# Altium footprint library WR-TBL_Rising Cage Clamp.PcbLib: 435 footprints (part 27 of 28)
Each footprint in its own frame and in the unit in brackets; x right, y up, seen from the top. Pads: shape width x height; smd on the part's side, far side on the other; paste and mask are expansions set on the pad; w line width, h text height; cw(c..) or ccw(c..) is an arc to the next point about the centre after c.
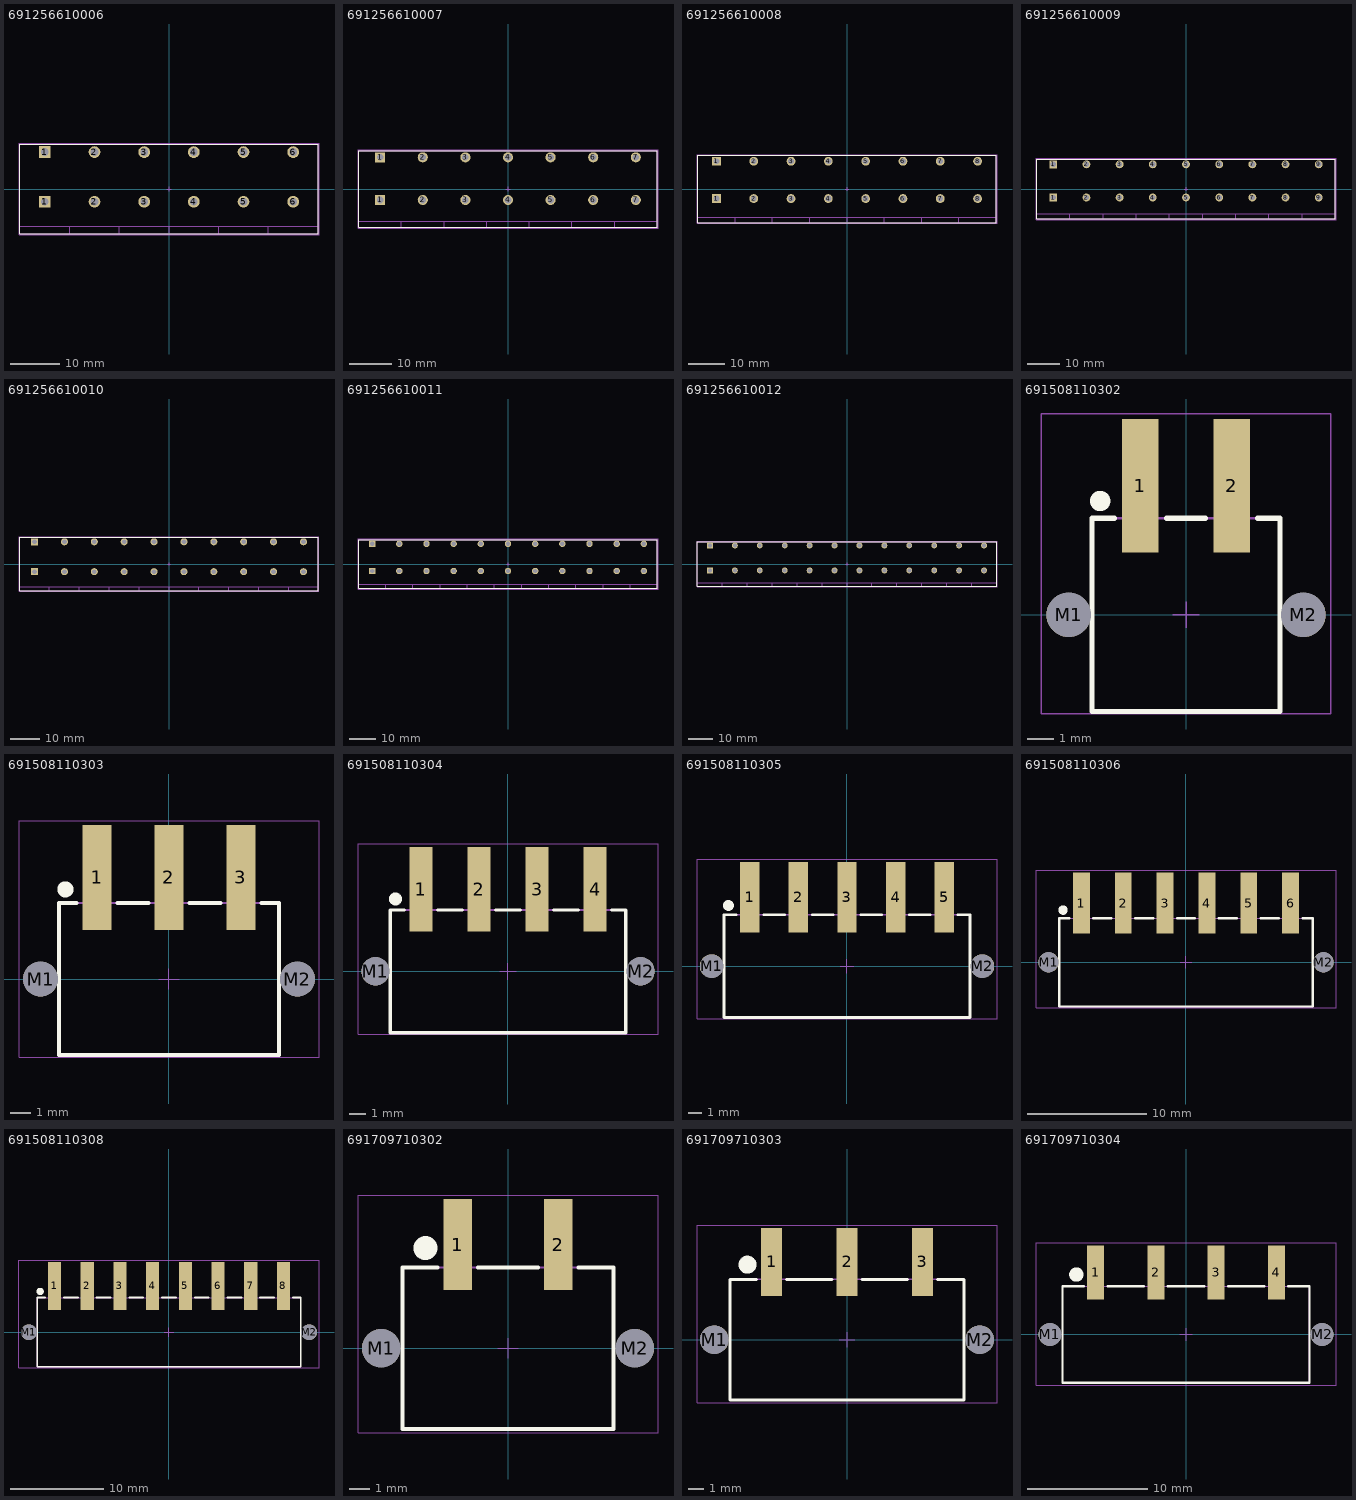
[diagram p26: the footprints below, top view; thin cyan lines are the x and y axes]

## 691256610006 [mm] "10.16mm Horizontal Cable Entry with Rising Cage Clamp, 06p"
height 29.3
pads (12):
  rect 2.4x2.4 hole 1.6: 1(-25.4,-2.61) 1(-25.4,7.55)
  round 2.4 hole 1.6: 2(-15.24,-2.61) 2(-15.24,7.55) 3(-5.08,-2.61) 3(-5.08,7.55) 4(5.08,-2.61) 4(5.08,7.55) 5(15.24,-2.61) 5(15.24,7.55) 6(25.4,-2.61) 6(25.4,7.55)
Top Overlay:
  lines w0.2: -30.48,-9.15 -30.48,9.15 30.48,9.15 30.48,-9.15 -30.48,-9.15
Mechanical 13:
  lines w0.1: -30.48,-7.65 30.48,-7.65 ; -20.32,-9.15 -20.32,-7.65 ; -10.16,-9.15 -10.16,-7.65 ; 0,-9.15 0,-7.65 ; 10.16,-9.15 10.16,-7.65 ; 20.32,-9.15 20.32,-7.65 ; -30.48,-9.15 30.48,-9.15 30.48,9.15 -30.48,9.15 -30.48,-9.15
Mechanical 15:
  lines w0.05: -0.5,0 0.5,0 ; 0,-0.5 0,0.5 ; -30.68,-9.35 -30.68,9.35 30.68,9.35 30.68,-9.35 -30.68,-9.35
3D body "691256610006.stp": height 29.33, standoff -4.97, extent -30.48,-9.15 30.48,9.15

## 691256610007 [mm] "10.16mm Horizontal Cable Entry with Rising Cage Clamp, 07p"
height 29.3
pads (14):
  rect 2.4x2.4 hole 1.6: 1(-30.48,-2.61) 1(-30.48,7.55)
  round 2.4 hole 1.6: 2(-20.32,-2.61) 2(-20.32,7.55) 3(-10.16,-2.61) 3(-10.16,7.55) 4(0,-2.61) 4(0,7.55) 5(10.16,-2.61) 5(10.16,7.55) 6(20.32,-2.61) 6(20.32,7.55) 7(30.48,-2.61) 7(30.48,7.55)
Top Overlay:
  lines w0.2: -35.56,-9.15 -35.56,9.15 35.56,9.15 35.56,-9.15 -35.56,-9.15
Mechanical 13:
  lines w0.1: -35.56,-7.65 35.56,-7.65 ; -25.4,-9.15 -25.4,-7.65 ; -15.24,-9.15 -15.24,-7.65 ; -5.08,-9.15 -5.08,-7.65 ; 5.08,-9.15 5.08,-7.65 ; 15.24,-9.15 15.24,-7.65 ; 25.4,-9.15 25.4,-7.65 ; -35.56,-9.15 35.56,-9.15 35.56,9.15 -35.56,9.15 -35.56,-9.15
Mechanical 15:
  lines w0.05: -0.5,0 0.5,0 ; 0,-0.5 0,0.5 ; -35.76,-9.35 -35.76,9.35 35.76,9.35 35.76,-9.35 -35.76,-9.35
3D body "691256610007.stp": height 29.33, standoff -4.97, extent -35.56,-9.15 35.56,9.15

## 691256610008 [mm] "10.16mm Horizontal Cable Entry with Rising Cage Clamp, 08p"
height 29.3
pads (16):
  rect 2.4x2.4 hole 1.6: 1(-35.56,-2.61) 1(-35.56,7.55)
  round 2.4 hole 1.6: 2(-25.4,-2.61) 2(-25.4,7.55) 3(-15.24,-2.61) 3(-15.24,7.55) 4(-5.08,-2.61) 4(-5.08,7.55) 5(5.08,-2.61) 5(5.08,7.55) 6(15.24,-2.61) 6(15.24,7.55) 7(25.4,-2.61) 7(25.4,7.55) 8(35.56,-2.61) 8(35.56,7.55)
Top Overlay:
  lines w0.2: -40.64,-9.15 40.64,-9.15 40.64,9.15 -40.64,9.15 -40.64,-9.15
Mechanical 13:
  lines w0.1: -40.64,-7.65 40.64,-7.65 ; -30.48,-9.15 -30.48,-7.65 ; -20.32,-9.15 -20.32,-7.65 ; -10.16,-9.15 -10.16,-7.65 ; 0,-9.15 0,-7.65 ; 10.16,-9.15 10.16,-7.65 ; 20.32,-9.15 20.32,-7.65 ; 30.48,-9.15 30.48,-7.65 ; -40.64,-9.15 -40.64,9.15 40.64,9.15 40.64,-9.15 -40.64,-9.15
Mechanical 15:
  lines w0.05: -0.5,0 0.5,0 ; 0,-0.5 0,0.5 ; -40.84,-9.35 40.84,-9.35 40.84,9.35 -40.84,9.35 -40.84,-9.35
3D body "691256610008.stp": height 29.33, standoff -4.97, extent -40.64,-9.15 40.64,9.15

## 691256610009 [mm] "10.16mm Horizontal Cable Entry with Rising Cage Clamp, 09p"
height 29.3
pads (18):
  rect 2.4x2.4 hole 1.6: 1(-40.64,-2.61) 1(-40.64,7.55)
  round 2.4 hole 1.6: 2(-30.48,-2.61) 2(-30.48,7.55) 3(-20.32,-2.61) 3(-20.32,7.55) 4(-10.16,-2.61) 4(-10.16,7.55) 5(0,-2.61) 5(0,7.55) 6(10.16,-2.61) 6(10.16,7.55) 7(20.32,-2.61) 7(20.32,7.55) 8(30.48,-2.61) 8(30.48,7.55) 9(40.64,-2.61) 9(40.64,7.55)
Top Overlay:
  lines w0.2: -45.72,-9.15 45.72,-9.15 45.72,9.15 -45.72,9.15 -45.72,-9.15
Mechanical 13:
  lines w0.1: -45.72,-7.65 45.72,-7.65 ; -35.56,-9.15 -35.56,-7.65 ; -25.4,-9.15 -25.4,-7.65 ; -15.24,-9.15 -15.24,-7.65 ; -5.08,-9.15 -5.08,-7.65 ; 5.08,-9.15 5.08,-7.65 ; 15.24,-9.15 15.24,-7.65 ; 25.4,-9.15 25.4,-7.65 ; 35.56,-9.15 35.56,-7.65 ; -45.72,-9.15 -45.72,9.15 45.72,9.15 45.72,-9.15 -45.72,-9.15
Mechanical 15:
  lines w0.05: -0.5,0 0.5,0 ; 0,-0.5 0,0.5 ; -45.92,-9.35 45.92,-9.35 45.92,9.35 -45.92,9.35 -45.92,-9.35
3D body "691256610009.stp": height 29.33, standoff -4.97, extent -45.72,-9.15 45.72,9.15

## 691256610010 [mm] "10.16mm Horizontal Cable Entry with Rising Cage Clamp, 10p"
height 29.3
pads (20):
  rect 2.4x2.4 hole 1.6: 1(-45.72,-2.61) 1(-45.72,7.55)
  round 2.4 hole 1.6: 2(-35.56,-2.61) 2(-35.56,7.55) 3(-25.4,-2.61) 3(-25.4,7.55) 4(-15.24,-2.61) 4(-15.24,7.55) 5(-5.08,-2.61) 5(-5.08,7.55) 6(5.08,-2.61) 6(5.08,7.55) 7(15.24,-2.61) 7(15.24,7.55) 8(25.4,-2.61) 8(25.4,7.55) 9(35.56,-2.61) 9(35.56,7.55) 10(45.72,-2.61) 10(45.72,7.55)
Top Overlay:
  lines w0.2: -50.8,-9.15 50.8,-9.15 50.8,9.15 -50.8,9.15 -50.8,-9.15
Mechanical 13:
  lines w0.1: -50.8,-7.65 50.8,-7.65 ; -40.64,-9.15 -40.64,-7.65 ; -30.48,-9.15 -30.48,-7.65 ; -20.32,-9.15 -20.32,-7.65 ; -10.16,-9.15 -10.16,-7.65 ; 0,-9.15 0,-7.65 ; 10.16,-9.15 10.16,-7.65 ; 20.32,-9.15 20.32,-7.65 ; 30.48,-9.15 30.48,-7.65 ; 40.64,-9.15 40.64,-7.65 ; -50.8,-9.15 -50.8,9.15 50.8,9.15 50.8,-9.15 -50.8,-9.15
Mechanical 15:
  lines w0.05: -0.5,0 0.5,0 ; 0,-0.5 0,0.5 ; -51,-9.35 51,-9.35 51,9.35 -51,9.35 -51,-9.35
3D body "691256610010.stp": height 29.33, standoff -4.97, extent -50.8,-9.15 50.8,9.15

## 691256610011 [mm] "10.16mm Horizontal Cable Entry with Rising Cage Clamp, 11p"
height 29.3
pads (22):
  rect 2.4x2.4 hole 1.6: 1(-50.8,-2.61) 1(-50.8,7.55)
  round 2.4 hole 1.6: 2(-40.64,-2.61) 2(-40.64,7.55) 3(-30.48,-2.61) 3(-30.48,7.55) 4(-20.32,-2.61) 4(-20.32,7.55) 5(-10.16,-2.61) 5(-10.16,7.55) 6(0,-2.61) 6(0,7.55) 7(10.16,-2.61) 7(10.16,7.55) 8(20.32,-2.61) 8(20.32,7.55) 9(30.48,-2.61) 9(30.48,7.55) 10(40.64,-2.61) 10(40.64,7.55) 11(50.8,-2.61) 11(50.8,7.55)
Top Overlay:
  lines w0.2: -55.88,-9.15 55.88,-9.15 55.88,9.15 -55.88,9.15 -55.88,-9.15
Mechanical 13:
  lines w0.1: -55.88,-7.65 55.88,-7.65 ; -45.72,-9.15 -45.72,-7.65 ; -35.56,-9.15 -35.56,-7.65 ; -25.4,-9.15 -25.4,-7.65 ; -15.24,-9.15 -15.24,-7.65 ; -5.08,-9.15 -5.08,-7.65 ; 5.08,-9.15 5.08,-7.65 ; 15.24,-9.15 15.24,-7.65 ; 25.4,-9.15 25.4,-7.65 ; 35.56,-9.15 35.56,-7.65 ; 45.72,-9.15 45.72,-7.65 ; -55.88,-9.15 -55.88,9.15 55.88,9.15 55.88,-9.15 -55.88,-9.15
Mechanical 15:
  lines w0.05: -0.5,0 0.5,0 ; 0,-0.5 0,0.5 ; -56.08,-9.35 56.08,-9.35 56.08,9.35 -56.08,9.35 -56.08,-9.35
3D body "691256610011.stp": height 29.33, standoff -4.97, extent -55.88,-9.15 55.88,9.15

## 691256610012 [mm] "10.16mm Horizontal Cable Entry with Rising Cage Clamp, 12p"
height 29.3
pads (24):
  rect 2.4x2.4 hole 1.6: 1(-55.88,-2.61) 1(-55.88,7.55)
  round 2.4 hole 1.6: 2(-45.72,-2.61) 2(-45.72,7.55) 3(-35.56,-2.61) 3(-35.56,7.55) 4(-25.4,-2.61) 4(-25.4,7.55) 5(-15.24,-2.61) 5(-15.24,7.55) 6(-5.08,-2.61) 6(-5.08,7.55) 7(5.08,-2.61) 7(5.08,7.55) 8(15.24,-2.61) 8(15.24,7.55) 9(25.4,-2.61) 9(25.4,7.55) 10(35.56,-2.61) 10(35.56,7.55) 11(45.72,-2.61) 11(45.72,7.55) 12(55.88,-2.61) 12(55.88,7.55)
Top Overlay:
  lines w0.2: -60.96,-9.15 -60.96,9.15 60.96,9.15 60.96,-9.15 -60.96,-9.15
Mechanical 13:
  lines w0.1: -60.96,-7.65 60.96,-7.65 ; -50.8,-9.15 -50.8,-7.65 ; -40.64,-9.15 -40.64,-7.65 ; -30.48,-9.15 -30.48,-7.65 ; -20.32,-9.15 -20.32,-7.65 ; -10.16,-9.15 -10.16,-7.65 ; 0,-9.15 0,-7.65 ; 10.16,-9.15 10.16,-7.65 ; 20.32,-9.15 20.32,-7.65 ; 30.48,-9.15 30.48,-7.65 ; 40.64,-9.15 40.64,-7.65 ; 50.8,-9.15 50.8,-7.65 ; -60.96,-9.15 60.96,-9.15 60.96,9.15 -60.96,9.15 -60.96,-9.15
Mechanical 15:
  lines w0.05: -0.5,0 0.5,0 ; 0,-0.5 0,0.5 ; -61.16,-9.35 -61.16,9.35 61.16,9.35 61.16,-9.35 -61.16,-9.35
3D body "691256610012.stp": height 29.33, standoff -4.97, extent -60.96,-9.15 60.96,9.15

## 691508110302 [mm] "WR-TBL Terminal block - serie 5081 3,50mm - SMT - Horizontal entry with rising clamp - 02p"
height 11.2
pads (4):
  rect 1.4x5.1 smd: 1(-1.75,4.95) 2(1.75,4.95)
  round 1.7 hole 1.7 unplated: M1(-4.5,0) M2(4.5,0)
Top Overlay:
  circle w0.5: c-3.29,4.365 r0.142
  lines w0.2: -2.75,3.7 -3.6,3.7 -3.6,-3.7 3.6,-3.7 3.6,3.7 2.75,3.7 ; -0.75,3.7 0.75,3.7
Mechanical 13:
  lines w0.1: -2.225,3.7 -2.225,7.2 -1.275,7.2 -1.275,3.7 ; 1.275,3.7 1.275,7.2 2.225,7.2 2.225,3.7 ; -3.6,-3.7 3.6,-3.7 3.6,3.7 -3.6,3.7 -3.6,-3.7
Mechanical 15:
  lines w0.05: -0.5,0 0.5,0 ; 0,-0.5 0,0.5 ; -5.55,-3.8 5.55,-3.8 5.55,7.7 -5.55,7.7 -5.55,-3.8
3D body "691508110302.stp": height 11.25, standoff -1.95, extent -5.175,-3.695 5.175,7.205

## 691508110303 [mm] "WR-TBL Terminal block - serie 5081 3,50mm - SMT - Horizontal entry with rising clamp - 03p"
height 11.2
pads (5):
  rect 1.4x5.1 smd: 1(-3.5,4.95) 2(0,4.95) 3(3.5,4.95)
  round 1.7 hole 1.7 unplated: M1(-6.25,0) M2(6.25,0)
Top Overlay:
  circle w0.5: c-5.04,4.365 r0.142
  lines w0.2: -4.5,3.7 -5.35,3.7 -5.35,-3.7 5.35,-3.7 5.35,3.7 4.5,3.7 ; -2.5,3.7 -1,3.7 ; 1,3.7 2.5,3.7
Mechanical 13:
  lines w0.1: -3.975,3.7 -3.975,7.2 -3.025,7.2 -3.025,3.7 ; -0.475,3.7 -0.475,7.2 0.475,7.2 0.475,3.7 ; 3.025,3.7 3.025,7.2 3.975,7.2 3.975,3.7 ; -5.35,-3.7 5.35,-3.7 5.35,3.7 -5.35,3.7 -5.35,-3.7
Mechanical 15:
  lines w0.05: -0.5,0 0.5,0 ; 0,-0.5 0,0.5 ; -7.3,-3.8 7.3,-3.8 7.3,7.7 -7.3,7.7 -7.3,-3.8
3D body "691508110303.stp": height 11.25, standoff -1.95, extent -6.925,-3.7 6.925,7.2

## 691508110304 [mm] "WR-TBL Terminal block - serie 5081 3,50mm - SMT - Horizontal entry with rising clamp - 04p"
height 11.2
pads (6):
  rect 1.4x5.1 smd: 1(-5.25,4.95) 2(-1.75,4.95) 3(1.75,4.95) 4(5.25,4.95)
  round 1.7 hole 1.7 unplated: M1(-8,0) M2(8,0)
Top Overlay:
  circle w0.5: c-6.79,4.365 r0.142
  lines w0.2: -6.25,3.7 -7.1,3.7 -7.1,-3.7 7.1,-3.7 7.1,3.7 6.25,3.7 ; -4.25,3.7 -2.75,3.7 ; -0.75,3.7 0.75,3.7 ; 2.75,3.7 4.25,3.7
Mechanical 13:
  lines w0.1: -5.725,3.7 -5.725,7.2 -4.775,7.2 -4.775,3.7 ; -2.225,3.7 -2.225,7.2 -1.275,7.2 -1.275,3.7 ; 1.275,3.7 1.275,7.2 2.225,7.2 2.225,3.7 ; 4.775,3.7 4.775,7.2 5.725,7.2 5.725,3.7 ; -7.1,-3.7 7.1,-3.7 7.1,3.7 -7.1,3.7 -7.1,-3.7
Mechanical 15:
  lines w0.05: -0.5,0 0.5,0 ; 0,-0.5 0,0.5 ; -9.05,-3.8 9.05,-3.8 9.05,7.7 -9.05,7.7 -9.05,-3.8
3D body "691508110304.stp": height 11.25, standoff -1.95, extent -8.675,-3.7 8.675,7.2

## 691508110305 [mm] "WR-TBL Terminal block - serie 5081 3,50mm - SMT - Horizontal entry with rising clamp - 05p"
height 11.2
pads (7):
  rect 1.4x5.1 smd: 1(-7,4.95) 2(-3.5,4.95) 3(0,4.95) 4(3.5,4.95) 5(7,4.95)
  round 1.7 hole 1.7 unplated: M1(-9.75,0) M2(9.75,0)
Top Overlay:
  circle w0.5: c-8.54,4.365 r0.142
  lines w0.2: -8,3.7 -8.85,3.7 -8.85,-3.7 8.85,-3.7 8.85,3.7 8,3.7 ; -6,3.7 -4.5,3.7 ; -2.5,3.7 -1,3.7 ; 1,3.7 2.5,3.7 ; 4.5,3.7 6,3.7
Mechanical 13:
  lines w0.1: -7.475,3.7 -7.475,7.2 -6.525,7.2 -6.525,3.7 ; -3.975,3.7 -3.975,7.2 -3.025,7.2 -3.025,3.7 ; -0.475,3.7 -0.475,7.2 0.475,7.2 0.475,3.7 ; 3.025,3.7 3.025,7.2 3.975,7.2 3.975,3.7 ; 6.525,3.7 6.525,7.2 7.475,7.2 7.475,3.7 ; -8.85,-3.7 8.85,-3.7 8.85,3.7 -8.85,3.7 -8.85,-3.7
Mechanical 15:
  lines w0.05: -0.5,0 0.5,0 ; 0,-0.5 0,0.5 ; -10.8,-3.8 10.8,-3.8 10.8,7.7 -10.8,7.7 -10.8,-3.8
3D body "691508110305.stp": height 11.25, standoff -1.95, extent -10.425,-3.7 10.425,7.2

## 691508110306 [mm] "WR-TBL Terminal block - serie 5081 3,50mm - SMT - Horizontal entry with rising clamp - 06p"
height 11.2
pads (8):
  rect 1.4x5.1 smd: 1(-8.75,4.95) 2(-5.25,4.95) 3(-1.75,4.95) 4(1.75,4.95) 5(5.25,4.95) 6(8.75,4.95)
  round 1.7 hole 1.7 unplated: M1(-11.5,0) M2(11.5,0)
Top Overlay:
  circle w0.5: c-10.29,4.365 r0.142
  lines w0.2: -9.75,3.7 -10.6,3.7 -10.6,-3.7 10.6,-3.7 10.6,3.7 9.75,3.7 ; -7.75,3.7 -6.25,3.7 ; -4.25,3.7 -2.75,3.7 ; -0.75,3.7 0.75,3.7 ; 2.75,3.7 4.25,3.7 ; 6.25,3.7 7.75,3.7
Mechanical 13:
  lines w0.1: -9.225,3.7 -9.225,7.2 -8.275,7.2 -8.275,3.7 ; -5.725,3.7 -5.725,7.2 -4.775,7.2 -4.775,3.7 ; -2.225,3.7 -2.225,7.2 -1.275,7.2 -1.275,3.7 ; 1.275,3.7 1.275,7.2 2.225,7.2 2.225,3.7 ; 4.775,3.7 4.775,7.2 5.725,7.2 5.725,3.7 ; 8.275,3.7 8.275,7.2 9.225,7.2 9.225,3.7 ; -10.6,-3.7 10.6,-3.7 10.6,3.7 -10.6,3.7 -10.6,-3.7
Mechanical 15:
  lines w0.05: -0.5,0 0.5,0 ; 0,-0.5 0,0.5 ; -12.55,-3.8 12.55,-3.8 12.55,7.7 -12.55,7.7 -12.55,-3.8
3D body "691508110306.stp": height 11.25, standoff -1.95, extent -12.175,-3.7 12.175,7.2

## 691508110308 [mm] "WR-TBL Terminal block - serie 5081 3,50mm - SMT - Horizontal entry with rising clamp - 08p"
height 11.2
pads (10):
  rect 1.4x5.1 smd: 1(-12.25,4.95) 2(-8.75,4.95) 3(-5.25,4.95) 4(-1.75,4.95) 5(1.75,4.95) 6(5.25,4.95) 7(8.75,4.95) 8(12.25,4.95)
  round 1.7 hole 1.7 unplated: M1(-15,0) M2(15,0)
Top Overlay:
  circle w0.5: c-13.79,4.365 r0.142
  lines w0.2: -13.25,3.7 -14.1,3.7 -14.1,-3.7 14.1,-3.7 14.1,3.7 13.25,3.7 ; -11.25,3.7 -9.75,3.7 ; -7.75,3.7 -6.25,3.7 ; -4.25,3.7 -2.75,3.7 ; -0.75,3.7 0.75,3.7 ; 2.75,3.7 4.25,3.7 ; 6.25,3.7 7.75,3.7 ; 9.75,3.7 11.25,3.7
Mechanical 13:
  lines w0.1: -12.725,3.7 -12.725,7.2 -11.775,7.2 -11.775,3.7 ; -9.225,3.7 -9.225,7.2 -8.275,7.2 -8.275,3.7 ; -5.725,3.7 -5.725,7.2 -4.775,7.2 -4.775,3.7 ; -2.225,3.7 -2.225,7.2 -1.275,7.2 -1.275,3.7 ; 1.275,3.7 1.275,7.2 2.225,7.2 2.225,3.7 ; 4.775,3.7 4.775,7.2 5.725,7.2 5.725,3.7 ; 8.275,3.7 8.275,7.2 9.225,7.2 9.225,3.7 ; 11.775,3.7 11.775,7.2 12.725,7.2 12.725,3.7 ; -14.1,-3.7 -14.1,3.7 14.1,3.7 14.1,-3.7 -14.1,-3.7
Mechanical 15:
  lines w0.05: -0.5,0 0.5,0 ; 0,-0.5 0,0.5 ; -16.05,-3.8 -16.05,7.7 16.05,7.7 16.05,-3.8 -16.05,-3.8
3D body "691508110308.stp": height 11.25, standoff -1.95, extent -15.675,-3.7 15.675,7.2

## 691709710302 [mm] "Horizontal Entry SMT with Pressure Clamp, pitch 5mm, 02p"
height 10.9
pads (4):
  rect 1.4x4.5 smd: 1(-2.5,5.15) 2(2.5,5.15)
  round 1.9 hole 1.9 unplated: M1(-6.3,0) M2(6.3,0)
Top Overlay:
  circle w0.8: c-4.1,4.975 r0.193
  lines w0.2: -3.5,4 -5.25,4 -5.25,-4 5.25,-4 5.25,4 3.5,4 ; -1.5,4 1.5,4
Mechanical 13:
  lines w0.1: -3,4 -3,7 -2,7 -2,4 ; 2,4 2,7 3,7 3,4 ; -5.25,-4 5.25,-4 5.25,4 -5.25,4 -5.25,-4
Mechanical 15:
  lines w0.05: -0.5,0 0.5,0 ; 0,-0.5 0,0.5 ; -7.45,-4.2 7.45,-4.2 7.45,7.6 -7.45,7.6 -7.45,-4.2
3D body "691709710302.stp": height 9.95, standoff -1.75, extent -7,-4 7,7

## 691709710303 [mm] "Horizontal Entry SMT with Pressure Clamp, pitch 5mm, 03p"
height 10.9
pads (5):
  rect 1.4x4.5 smd: 1(-5,5.15) 2(0,5.15) 3(5,5.15)
  round 1.9 hole 1.9 unplated: M1(-8.8,0) M2(8.8,0)
Top Overlay:
  circle w0.8: c-6.6,4.975 r0.193
  lines w0.2: -6,4 -7.75,4 -7.75,-4 7.75,-4 7.75,4 6,4 ; -4,4 -1,4 ; 1,4 4,4
Mechanical 13:
  lines w0.1: -5.5,4 -5.5,7 -4.5,7 -4.5,4 ; -0.5,4 -0.5,7 0.5,7 0.5,4 ; 4.5,4 4.5,7 5.5,7 5.5,4 ; -7.75,-4 -7.75,4 7.75,4 7.75,-4 -7.75,-4
Mechanical 15:
  lines w0.05: -0.5,0 0.5,0 ; 0,-0.5 0,0.5 ; -9.95,-4.2 -9.95,7.6 9.95,7.6 9.95,-4.2 -9.95,-4.2
3D body "691709710303.stp": height 9.95, standoff -1.75, extent -9.5,-4 9.5,7

## 691709710304 [mm] "Horizontal Entry SMT with Pressure Clamp, pitch 5mm, 04p"
height 10.9
pads (6):
  rect 1.4x4.5 smd: 1(-7.5,5.15) 2(-2.5,5.15) 3(2.5,5.15) 4(7.5,5.15)
  round 1.9 hole 1.9 unplated: M1(-11.3,0) M2(11.3,0)
Top Overlay:
  circle w0.8: c-9.1,4.975 r0.193
  lines w0.2: -8.5,4 -10.25,4 -10.25,-4 10.25,-4 10.25,4 8.5,4 ; -6.5,4 -3.5,4 ; -1.5,4 1.5,4 ; 3.5,4 6.5,4
Mechanical 13:
  lines w0.1: -8,4 -8,7 -7,7 -7,4 ; -3,4 -3,7 -2,7 -2,4 ; 2,4 2,7 3,7 3,4 ; 7,4 7,7 8,7 8,4 ; -10.25,-4 -10.25,4 10.25,4 10.25,-4 -10.25,-4
Mechanical 15:
  lines w0.05: -0.5,0 0.5,0 ; 0,-0.5 0,0.5 ; -12.45,-4.2 -12.45,7.6 12.45,7.6 12.45,-4.2 -12.45,-4.2
3D body "691709710304.stp": height 9.95, standoff -1.75, extent -12,-4 12,7